# Altium schematic symbol library 13-Logicold 逻辑 IC.SchLib: 297 symbols (part 4 of 30) (continued)
## A3P1000-1PQG208I (continued)
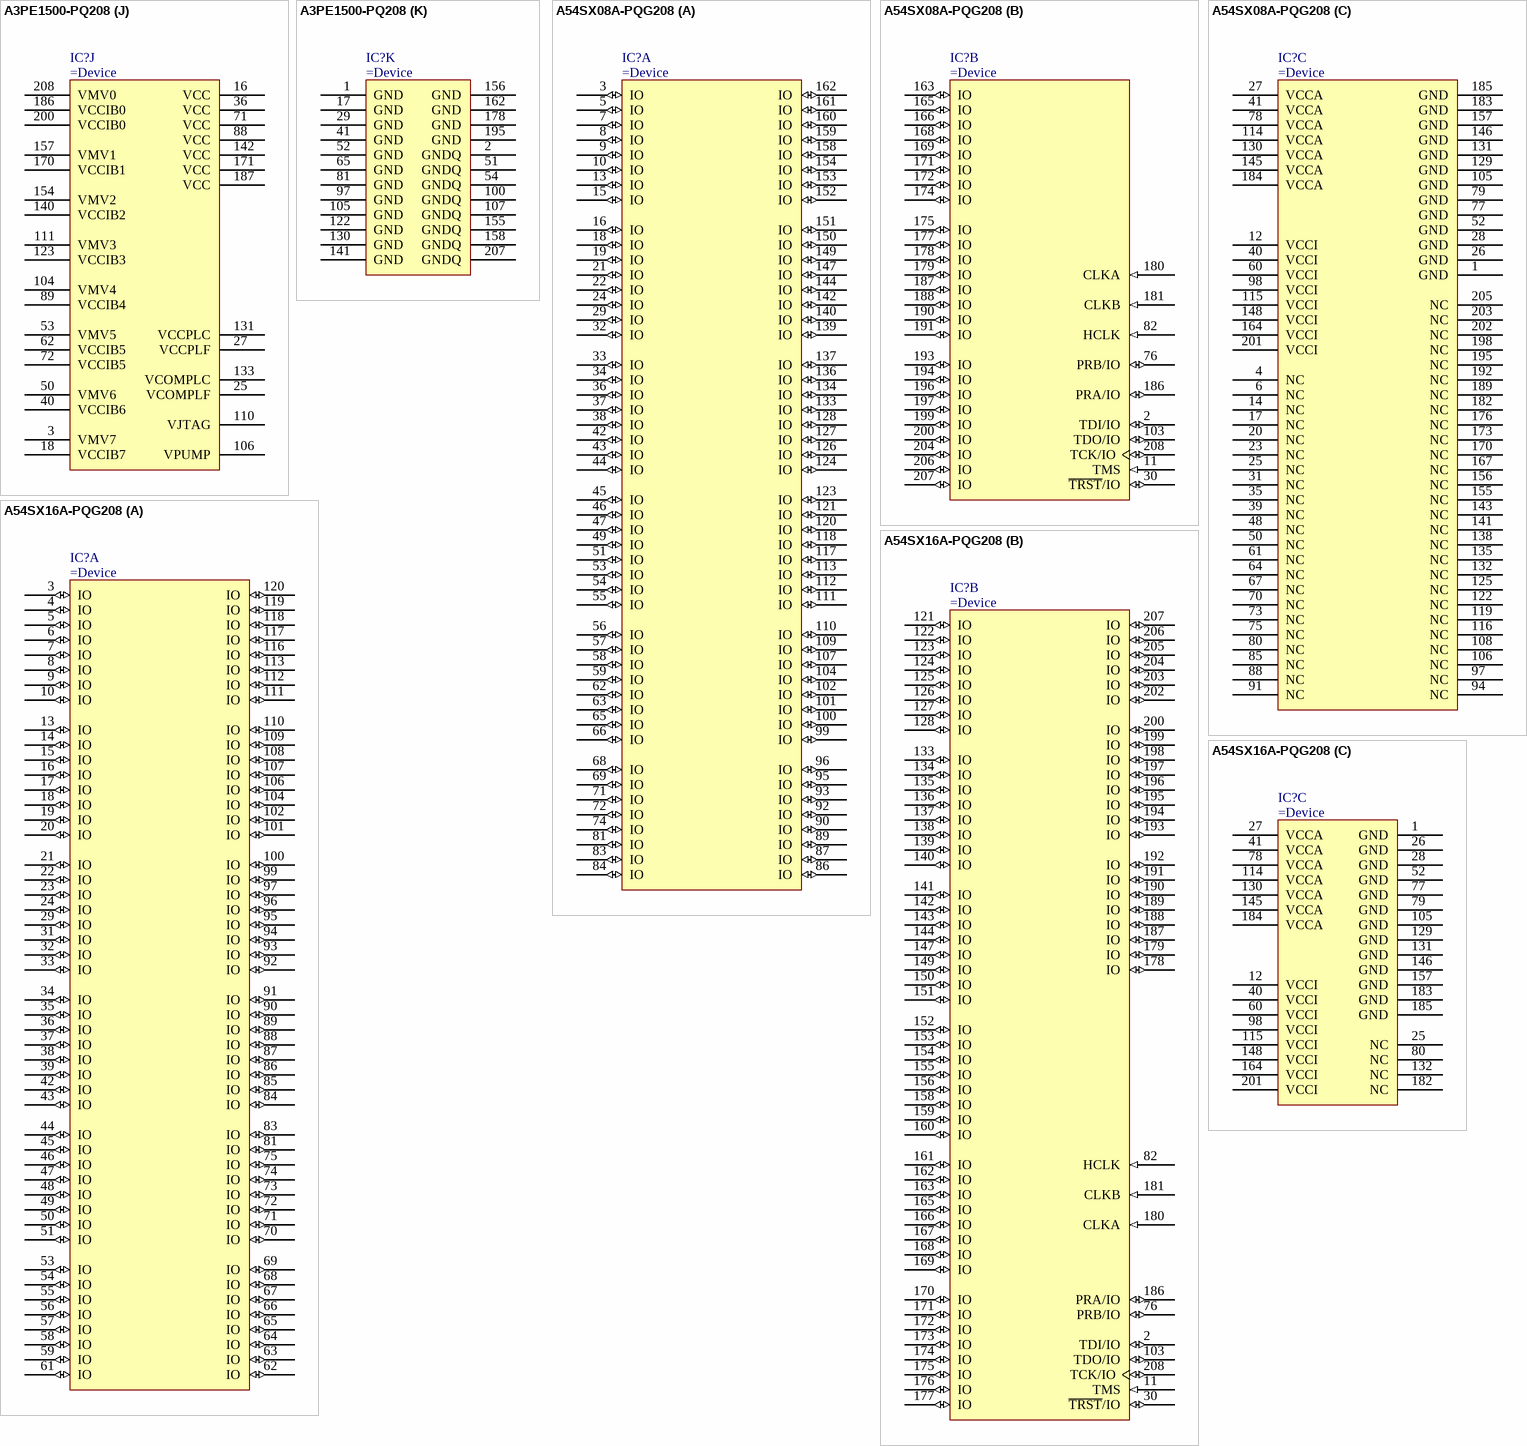
[diagram p22: symbols A3PE1500-PQ208 to A54SX16A-PQG208]
part A text: BANK 0
part B text: BANK 1
part C text: BANK 2
part D text: BANK 3

## A3PE1500-PQ208
designator IC?
ProASIC3E Flash Family FPGA, 147 User IOs, 1.5M System Gates, 270 Kbits RAM, 1 Kbit FlashROM, 2 PLLs, 208-Pin PQFP, Commercial Grade
part A pins: 177 IO31PDB0V3 (io), 179 IO31NDB0V3 (io), 180 IO29PDB0V3 (io), 181 IO29NDB0V3 (io), 182 IO27PDB0V3 (io), 183 IO27NDB0V3 (io), 184 IO23PDB0V2 (io), 185 IO23NDB0V2 (io), 188 IO18PDB0V2 (io), 189 IO18NDB0V2 (io), 190 IO15PDB0V1 (io), 191 IO15NDB0V1 (io), 192 IO12PSB0V1 (io), 193 IO11PDB0V1 (io), 194 IO11NDB0V1 (io), 196 IO08PDB0V1 (io), 197 IO08NDB0V1 (io), 198 IO05PDB0V0 (io), 199 IO05NDB0V0 (io), 201 GAC1/IO02PDB0V0 (io), 202 GAC0/IO02NDB0V0 (io), 203 GAB1/IO01PDB0V0 (io), 204 GAB0/IO01NDB0V0 (io), 205 GAA1/IO00PDB0V0 (io), 206 GAA0/IO00NDB0V0 (io)
part B pins: 159 GBA1/IO57PDB1V3 (io), 160 GBA0/IO57NDB1V3 (io), 161 GBB1/IO56PDB1V3 (io), 163 GBB0/IO56NDB1V3 (io), 164 GBC1/IO55PDB1V3 (io), 165 GBC0/IO55NDB1V3 (io), 166 IO51PDB1V2 (io), 167 IO51NDB1V2 (io), 168 IO47PDB1V1 (io), 169 IO47NDB1V1 (io), 172 IO43PSB1V1 (io), 173 IO41PDB1V1 (io), 174 IO41NDB1V1 (io), 175 IO35PDB1V0 (io), 176 IO35NDB1V0 (io)
part C pins: 134 GCB0/IO86NDB2V3 (io), 135 GCB1/IO86PDB2V3 (io), 136 GCC1/IO85PSB2V3 (io), 137 IO83NDB2V3 (io), 138 IO83PDB2V3 (io), 139 IO81PSB2V3 (io), 143 IO73NDB2V2 (io), 144 IO73PDB2V2 (io), 145 IO71NDB2V2 (io), 146 IO71PDB2V2 (io), 147 IO67NDB2V1 (io), 148 IO67PDB2V1 (io), 149 IO65NDB2V1 (io), 150 IO65PDB2V1 (io), 151 GBC2/IO60PSB2V0 (io), 152 GBA2/IO58PSB2V0 (io), 153 GBB2/IO59PSB2V0 (io)
part D pins: 112 GDA0/IO110NPB3V2 (io), 113 GDB0/IO109NPB3V2 (io), 114 GDA1/IO110PPB3V2 (io), 115 GDB1/IO109PPB3V2 (io), 116 GDC0/IO108NDB3V2 (io), 117 GDC1/IO108PDB3V2 (io), 118 IO105NDB3V2 (io), 119 IO105PDB3V2 (io), 120 IO101NDB3V1 (io), 121 IO101PDB3V1 (io), 124 GCC2/IO90PSB3V0 (io), 125 GCB2/IO89PSB3V0 (io), 127 IO88NDB3V0 (io), 128 GCA2/IO88PDB3V0 (io), 129 GCA1/IO87PPB3V0 (io), 132 GCA0/IO87NPB3V0 (io)
part E pins: 82 IO131NDB4V2 (io), 83 IO131PDB4V2 (io), 84 IO129NDB4V2 (io), 85 IO129PDB4V2 (io), 86 IO127NDB4V2 (io), 87 IO127PDB4V2 (io), 90 IO121NDB4V1 (io), 91 IO121PDB4V1 (io), 92 IO119NDB4V1 (io), 93 IO119PDB4V1 (io), 94 IO113NDB4V0 (io), 95 GDC2/IO113PDB4V0 (io), 96 IO112NDB4V0 (io), 98 GDB2/IO112PDB4V0 (io), 99 GDA2/IO111PSB4V0 (io)
part F pins: 55 IO166NDB5V3 (io), 56 GEA2/IO166PDB5V3 (io), 57 IO165NDB5V3 (io), 58 GEB2/IO165PDB5V3 (io), 59 IO164NDB5V3 (io), 60 GEC2/IO164PDB5V3 (io), 61 IO163PSB5V3 (io), 63 IO161PSB5V3 (io), 64 IO157NDB5V2 (io), 66 IO157PDB5V2 (io), 67 IO153NDB5V2 (io), 68 IO153PDB5V2 (io), 69 IO149NDB5V1 (io), 70 IO149PDB5V1 (io), 73 IO145NDB5V1 (io), 74 IO145PDB5V1 (io), 75 IO143NDB5V1 (io), 76 IO143PDB5V1 (io), 77 IO137NDB5V0 (io), 78 IO137PDB5V0 (io), 79 IO135NDB5V0 (io), 80 IO135PDB5V0 (io)
part G pins: 26 GFA0/IO190NPB6V2 (io), 28 GFA1/IO190PPB6V2 (io), 30 GFA2/IO189PDB6V2 (io), 31 IO189NDB6V2 (io), 32 GFB2/IO188PPB6V2 (io), 33 GFC2/IO187PPB6V2 (io), 34 IO188NPB6V2 (io), 35 IO187NPB6V2 (io), 37 IO184PDB6V2 (io), 38 IO184NDB6V2 (io), 39 IO180PSB6V1 (io), 42 IO176PDB6V1 (io), 43 IO176NDB6V1 (io), 44 GEC1/IO169PDB6V0 (io), 45 GEC0/IO169NDB6V0 (io), 46 GEB1/IO168PPB6V0 (io), 47 GEA1/IO167PPB6V0 (io), 48 GEB0/IO168NPB6V0 (io), 49 GEA0/IO167NPB6V0 (io)
part H pins: 4 GAB2/IO220PSB7V3 (io), 5 GAA2/IO221PDB7V3 (io), 6 IO221NDB7V3 (io), 7 GAC2/IO219PDB7V3 (io), 8 IO219NDB7V3 (io), 9 IO215PDB7V3 (io), 10 IO215NDB7V3 (io), 11 IO212PDB7V2 (io), 12 IO212NDB7V2 (io), 13 IO208PDB7V2 (io), 14 IO208NDB7V2 (io), 15 IO204PSB7V1 (io), 19 IO200PDB7V1 (io), 20 IO200NDB7V1 (io), 21 IO196PSB7V0 (io), 22 GFC1/IO192PSB7V0 (io), 23 GFB1/IO191PDB7V0 (io), 24 GFB0/IO191NDB7V0 (io)
part I pins: 101 TCK (in), 102 TDI (in), 103 TMS (in), 108 TDO (out), 109 ~{TRST} (in), 126 NC
part J pins: 3 VMV7 (power), 16 VCC (power), 18 VCCIB7 (power), 25 VCOMPLF (power), 27 VCCPLF (power), 36 VCC (power), 40 VCCIB6 (power), 50 VMV6 (power), 53 VMV5 (power), 62 VCCIB5 (power), 71 VCC (power), 72 VCCIB5 (power), 88 VCC (power), 89 VCCIB4 (power), 104 VMV4 (power), 106 VPUMP (power), 110 VJTAG (power), 111 VMV3 (power), 123 VCCIB3 (power), 131 VCCPLC (power), 133 VCOMPLC (power), 140 VCCIB2 (power), 142 VCC (power), 154 VMV2 (power), 157 VMV1 (power), 170 VCCIB1 (power), 171 VCC (power), 186 VCCIB0 (power), 187 VCC (power), 200 VCCIB0 (power), 208 VMV0 (power)
part K pins: 1 GND (power), 2 GNDQ (power), 17 GND (power), 29 GND (power), 41 GND (power), 51 GNDQ (power), 52 GND (power), 54 GNDQ (power), 65 GND (power), 81 GND (power), 97 GND (power), 100 GNDQ (power), 105 GND (power), 107 GNDQ (power), 122 GND (power), 130 GND (power), 141 GND (power), 155 GNDQ (power), 156 GND (power), 158 GNDQ (power), 162 GND (power), 178 GND (power), 195 GND (power), 207 GNDQ (power)
part A text: BANK 0
part B text: BANK 1
part C text: BANK 2
part D text: BANK 3
part E text: BANK 4
part F text: BANK 5
part G text: BANK 6
part H text: BANK 7

## A54SX08A-PQG208
designator IC?
A54SX16A FPGA, 130 User IOs, 208-Pin PQFP, Standard Speed Grade, Commercial Grade, Pb-Free
part A pins: 3 IO (io), 5 IO (io), 7 IO (io), 8 IO (io), 9 IO (io), 10 IO (io), 13 IO (io), 15 IO (io), 16 IO (io), 18 IO (io), 19 IO (io), 21 IO (io), 22 IO (io), 24 IO (io), 29 IO (io), 32 IO (io), 33 IO (io), 34 IO (io), 36 IO (io), 37 IO (io), 38 IO (io), 42 IO (io), 43 IO (io), 44 IO (io), 45 IO (io), 46 IO (io), 47 IO (io), 49 IO (io), 51 IO (io), 53 IO (io), 54 IO (io), 55 IO (io), 56 IO (io), 57 IO (io), 58 IO (io), 59 IO (io), 62 IO (io), 63 IO (io), 65 IO (io), 66 IO (io), 68 IO (io), 69 IO (io), 71 IO (io), 72 IO (io), 74 IO (io), 81 IO (io), 83 IO (io), 84 IO (io), 86 IO (io), 87 IO (io), 89 IO (io), 90 IO (io), 92 IO (io), 93 IO (io), 95 IO (io), 96 IO (io), 99 IO (io), 100 IO (io), 101 IO (io), 102 IO (io), 104 IO (io), 107 IO (io), 109 IO (io), 110 IO (io), 111 IO (io), 112 IO (io), 113 IO (io), 117 IO (io), 118 IO (io), 120 IO (io), 121 IO (io), 123 IO (io), 124 IO (io), 126 IO (io), 127 IO (io), 128 IO (io), 133 IO (io), 134 IO (io), 136 IO (io), 137 IO (io), 139 IO (io), 140 IO (io), 142 IO (io), 144 IO (io), 147 IO (io), 149 IO (io), 150 IO (io), 151 IO (io), 152 IO (io), 153 IO (io), 154 IO (io), 158 IO (io), 159 IO (io), 160 IO (io), 161 IO (io), 162 IO (io)
part B pins: 2 TDI/IO (io), 11 TMS (in), 30 ~{TRST}/IO (io), 76 PRB/IO (io), 82 HCLK (in), 103 TDO/IO (io), 163 IO (io), 165 IO (io), 166 IO (io), 168 IO (io), 169 IO (io), 171 IO (io), 172 IO (io), 174 IO (io), 175 IO (io), 177 IO (io), 178 IO (io), 179 IO (io), 180 CLKA (in), 181 CLKB (in), 186 PRA/IO (io), 187 IO (io), 188 IO (io), 190 IO (io), 191 IO (io), 193 IO (io), 194 IO (io), 196 IO (io), 197 IO (io), 199 IO (io), 200 IO (io), 204 IO (io), 206 IO (io), 207 IO (io), 208 TCK/IO (io)
part C pins: 1 GND (power), 4 NC, 6 NC, 12 VCCI (power), 14 NC, 17 NC, 20 NC, 23 NC, 25 NC, 26 GND (power), 27 VCCA (power), 28 GND (power), 31 NC, 35 NC, 39 NC, 40 VCCI (power), 41 VCCA (power), 48 NC, 50 NC, 52 GND (power), 60 VCCI (power), 61 NC, 64 NC, 67 NC, 70 NC, 73 NC, 75 NC, 77 GND (power), 78 VCCA (power), 79 GND (power), 80 NC, 85 NC, 88 NC, 91 NC, 94 NC, 97 NC, 98 VCCI (power), 105 GND (power), 106 NC, 108 NC, 114 VCCA (power), 115 VCCI (power), 116 NC, 119 NC, 122 NC, 125 NC, 129 GND (power), 130 VCCA (power), 131 GND (power), 132 NC, 135 NC, 138 NC, 141 NC, 143 NC, 145 VCCA (power), 146 GND (power), 148 VCCI (power), 155 NC, 156 NC, 157 GND (power), 164 VCCI (power), 167 NC, 170 NC, 173 NC, 176 NC, 182 NC, 183 GND (power), 184 VCCA (power), 185 GND (power), 189 NC, 192 NC, 195 NC, 198 NC, 201 VCCI (power), 202 NC, 203 NC, 205 NC

## A54SX16A-PQG208
designator IC?
A54SX16A FPGA, 175 User IOs, 208-Pin PQFP, Standard Speed Grade, Commercial Grade, Pb-Free
part A pins: 3 IO (io), 4 IO (io), 5 IO (io), 6 IO (io), 7 IO (io), 8 IO (io), 9 IO (io), 10 IO (io), 13 IO (io), 14 IO (io), 15 IO (io), 16 IO (io), 17 IO (io), 18 IO (io), 19 IO (io), 20 IO (io), 21 IO (io), 22 IO (io), 23 IO (io), 24 IO (io), 29 IO (io), 31 IO (io), 32 IO (io), 33 IO (io), 34 IO (io), 35 IO (io), 36 IO (io), 37 IO (io), 38 IO (io), 39 IO (io), 42 IO (io), 43 IO (io), 44 IO (io), 45 IO (io), 46 IO (io), 47 IO (io), 48 IO (io), 49 IO (io), 50 IO (io), 51 IO (io), 53 IO (io), 54 IO (io), 55 IO (io), 56 IO (io), 57 IO (io), 58 IO (io), 59 IO (io), 61 IO (io), 62 IO (io), 63 IO (io), 64 IO (io), 65 IO (io), 66 IO (io), 67 IO (io), 68 IO (io), 69 IO (io), 70 IO (io), 71 IO (io), 72 IO (io), 73 IO (io), 74 IO (io), 75 IO (io), 81 IO (io), 83 IO (io), 84 IO (io), 85 IO (io), 86 IO (io), 87 IO (io), 88 IO (io), 89 IO (io), 90 IO (io), 91 IO (io), 92 IO (io), 93 IO (io), 94 IO (io), 95 IO (io), 96 IO (io), 97 IO (io), 99 IO (io), 100 IO (io), 101 IO (io), 102 IO (io), 104 IO (io), 106 IO (io), 107 IO (io), 108 IO (io), 109 IO (io), 110 IO (io), 111 IO (io), 112 IO (io), 113 IO (io), 116 IO (io), 117 IO (io), 118 IO (io), 119 IO (io), 120 IO (io)
part B pins: 2 TDI/IO (io), 11 TMS (in), 30 ~{TRST}/IO (io), 76 PRB/IO (io), 82 HCLK (in), 103 TDO/IO (io), 121 IO (io), 122 IO (io), 123 IO (io), 124 IO (io), 125 IO (io), 126 IO (io), 127 IO (io), 128 IO (io), 133 IO (io), 134 IO (io), 135 IO (io), 136 IO (io), 137 IO (io), 138 IO (io), 139 IO (io), 140 IO (io), 141 IO (io), 142 IO (io), 143 IO (io), 144 IO (io), 147 IO (io), 149 IO (io), 150 IO (io), 151 IO (io), 152 IO (io), 153 IO (io), 154 IO (io), 155 IO (io), 156 IO (io), 158 IO (io), 159 IO (io), 160 IO (io), 161 IO (io), 162 IO (io), 163 IO (io), 165 IO (io), 166 IO (io), 167 IO (io), 168 IO (io), 169 IO (io), 170 IO (io), 171 IO (io), 172 IO (io), 173 IO (io), 174 IO (io), 175 IO (io), 176 IO (io), 177 IO (io), 178 IO (io), 179 IO (io), 180 CLKA (in), 181 CLKB (in), 186 PRA/IO (io), 187 IO (io), 188 IO (io), 189 IO (io), 190 IO (io), 191 IO (io), 192 IO (io), 193 IO (io), 194 IO (io), 195 IO (io), 196 IO (io), 197 IO (io), 198 IO (io), 199 IO (io), 200 IO (io), 202 IO (io), 203 IO (io), 204 IO (io), 205 IO (io), 206 IO (io), 207 IO (io), 208 TCK/IO (io)
part C pins: 1 GND (power), 12 VCCI (power), 25 NC, 26 GND (power), 27 VCCA (power), 28 GND (power), 40 VCCI (power), 41 VCCA (power), 52 GND (power), 60 VCCI (power), 77 GND (power), 78 VCCA (power), 79 GND (power), 80 NC, 98 VCCI (power), 105 GND (power), 114 VCCA (power), 115 VCCI (power), 129 GND (power), 130 VCCA (power), 131 GND (power), 132 NC, 145 VCCA (power), 146 GND (power), 148 VCCI (power), 157 GND (power), 164 VCCI (power), 182 NC, 183 GND (power), 184 VCCA (power), 185 GND (power), 201 VCCI (power)

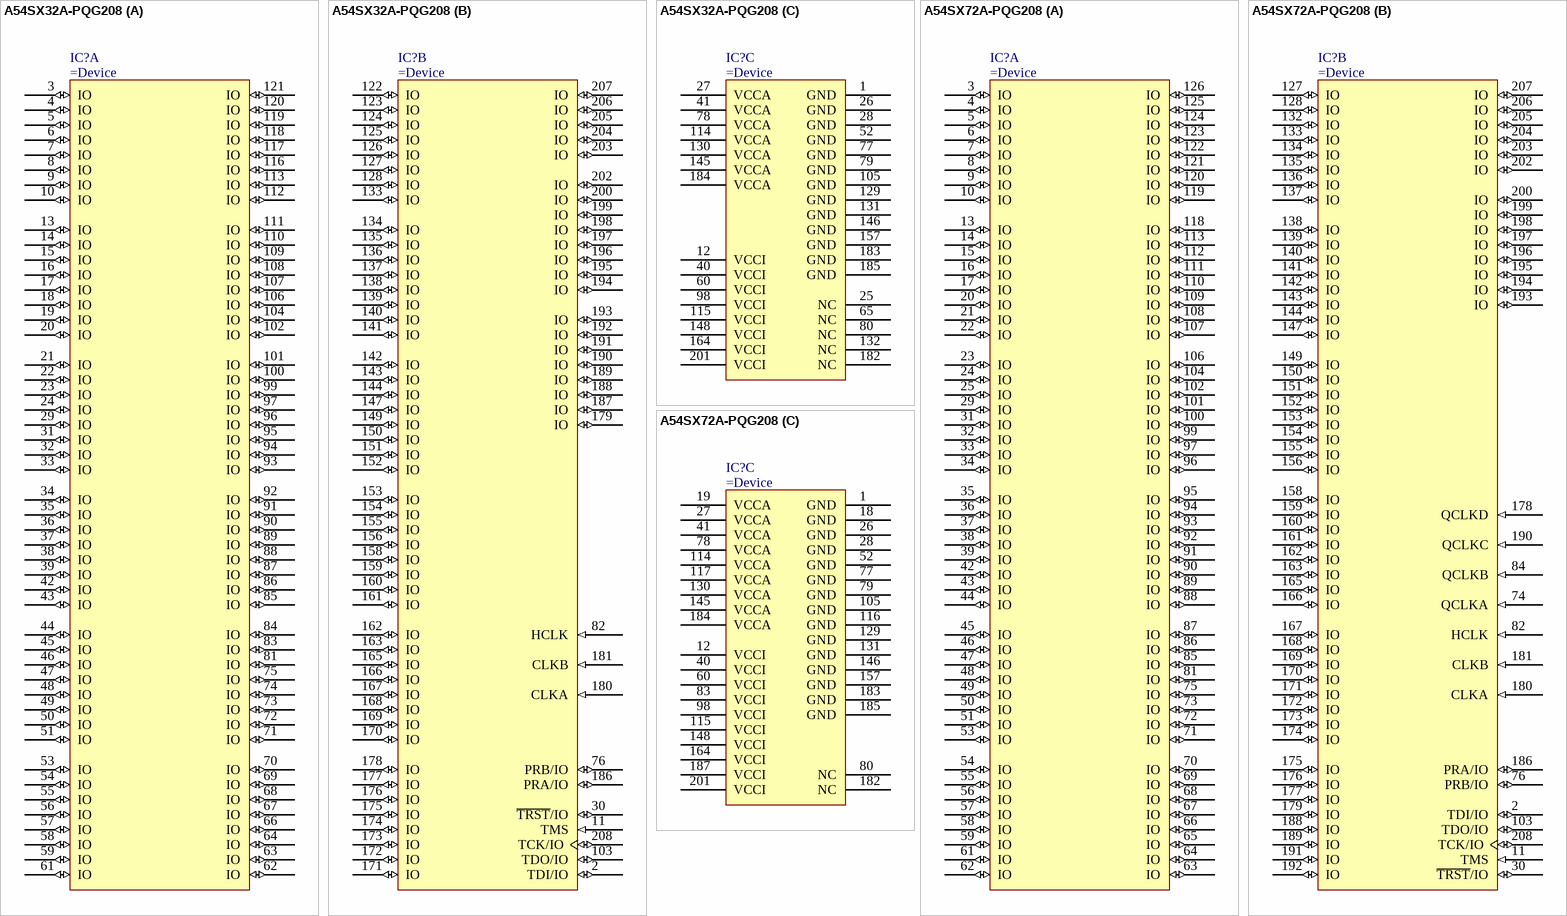
[diagram p23: symbols A54SX32A-PQG208 to A54SX72A-PQG208]

## A54SX32A-PQG208
designator IC?
A54SX32A FPGA, 174 User IOs, 208-Pin PQFP, Standard Speed Grade, Commercial Grade, Pb-Free
part A pins: 3 IO (io), 4 IO (io), 5 IO (io), 6 IO (io), 7 IO (io), 8 IO (io), 9 IO (io), 10 IO (io), 13 IO (io), 14 IO (io), 15 IO (io), 16 IO (io), 17 IO (io), 18 IO (io), 19 IO (io), 20 IO (io), 21 IO (io), 22 IO (io), 23 IO (io), 24 IO (io), 29 IO (io), 31 IO (io), 32 IO (io), 33 IO (io), 34 IO (io), 35 IO (io), 36 IO (io), 37 IO (io), 38 IO (io), 39 IO (io), 42 IO (io), 43 IO (io), 44 IO (io), 45 IO (io), 46 IO (io), 47 IO (io), 48 IO (io), 49 IO (io), 50 IO (io), 51 IO (io), 53 IO (io), 54 IO (io), 55 IO (io), 56 IO (io), 57 IO (io), 58 IO (io), 59 IO (io), 61 IO (io), 62 IO (io), 63 IO (io), 64 IO (io), 66 IO (io), 67 IO (io), 68 IO (io), 69 IO (io), 70 IO (io), 71 IO (io), 72 IO (io), 73 IO (io), 74 IO (io), 75 IO (io), 81 IO (io), 83 IO (io), 84 IO (io), 85 IO (io), 86 IO (io), 87 IO (io), 88 IO (io), 89 IO (io), 90 IO (io), 91 IO (io), 92 IO (io), 93 IO (io), 94 IO (io), 95 IO (io), 96 IO (io), 97 IO (io), 99 IO (io), 100 IO (io), 101 IO (io), 102 IO (io), 104 IO (io), 106 IO (io), 107 IO (io), 108 IO (io), 109 IO (io), 110 IO (io), 111 IO (io), 112 IO (io), 113 IO (io), 116 IO (io), 117 IO (io), 118 IO (io), 119 IO (io), 120 IO (io), 121 IO (io)
part B pins: 2 TDI/IO (io), 11 TMS (in), 30 ~{TRST}/IO (io), 76 PRB/IO (io), 82 HCLK (in), 103 TDO/IO (io), 122 IO (io), 123 IO (io), 124 IO (io), 125 IO (io), 126 IO (io), 127 IO (io), 128 IO (io), 133 IO (io), 134 IO (io), 135 IO (io), 136 IO (io), 137 IO (io), 138 IO (io), 139 IO (io), 140 IO (io), 141 IO (io), 142 IO (io), 143 IO (io), 144 IO (io), 147 IO (io), 149 IO (io), 150 IO (io), 151 IO (io), 152 IO (io), 153 IO (io), 154 IO (io), 155 IO (io), 156 IO (io), 158 IO (io), 159 IO (io), 160 IO (io), 161 IO (io), 162 IO (io), 163 IO (io), 165 IO (io), 166 IO (io), 167 IO (io), 168 IO (io), 169 IO (io), 170 IO (io), 171 IO (io), 172 IO (io), 173 IO (io), 174 IO (io), 175 IO (io), 176 IO (io), 177 IO (io), 178 IO (io), 179 IO (io), 180 CLKA (in), 181 CLKB (in), 186 PRA/IO (io), 187 IO (io), 188 IO (io), 189 IO (io), 190 IO (io), 191 IO (io), 192 IO (io), 193 IO (io), 194 IO (io), 195 IO (io), 196 IO (io), 197 IO (io), 198 IO (io), 199 IO (io), 200 IO (io), 202 IO (io), 203 IO (io), 204 IO (io), 205 IO (io), 206 IO (io), 207 IO (io), 208 TCK/IO (io)
part C pins: 1 GND (power), 12 VCCI (power), 25 NC, 26 GND (power), 27 VCCA (power), 28 GND (power), 40 VCCI (power), 41 VCCA (power), 52 GND (power), 60 VCCI (power), 65 NC, 77 GND (power), 78 VCCA (power), 79 GND (power), 80 NC, 98 VCCI (power), 105 GND (power), 114 VCCA (power), 115 VCCI (power), 129 GND (power), 130 VCCA (power), 131 GND (power), 132 NC, 145 VCCA (power), 146 GND (power), 148 VCCI (power), 157 GND (power), 164 VCCI (power), 182 NC, 183 GND (power), 184 VCCA (power), 185 GND (power), 201 VCCI (power)

## A54SX72A-PQG208
designator IC?
A54SX72A FPGA, 171 User IOs, 208-Pin PQFP, Standard Speed Grade, Commercial Grade, Pb-Free
part A pins: 3 IO (io), 4 IO (io), 5 IO (io), 6 IO (io), 7 IO (io), 8 IO (io), 9 IO (io), 10 IO (io), 13 IO (io), 14 IO (io), 15 IO (io), 16 IO (io), 17 IO (io), 20 IO (io), 21 IO (io), 22 IO (io), 23 IO (io), 24 IO (io), 25 IO (io), 29 IO (io), 31 IO (io), 32 IO (io), 33 IO (io), 34 IO (io), 35 IO (io), 36 IO (io), 37 IO (io), 38 IO (io), 39 IO (io), 42 IO (io), 43 IO (io), 44 IO (io), 45 IO (io), 46 IO (io), 47 IO (io), 48 IO (io), 49 IO (io), 50 IO (io), 51 IO (io), 53 IO (io), 54 IO (io), 55 IO (io), 56 IO (io), 57 IO (io), 58 IO (io), 59 IO (io), 61 IO (io), 62 IO (io), 63 IO (io), 64 IO (io), 65 IO (io), 66 IO (io), 67 IO (io), 68 IO (io), 69 IO (io), 70 IO (io), 71 IO (io), 72 IO (io), 73 IO (io), 75 IO (io), 81 IO (io), 85 IO (io), 86 IO (io), 87 IO (io), 88 IO (io), 89 IO (io), 90 IO (io), 91 IO (io), 92 IO (io), 93 IO (io), 94 IO (io), 95 IO (io), 96 IO (io), 97 IO (io), 99 IO (io), 100 IO (io), 101 IO (io), 102 IO (io), 104 IO (io), 106 IO (io), 107 IO (io), 108 IO (io), 109 IO (io), 110 IO (io), 111 IO (io), 112 IO (io), 113 IO (io), 118 IO (io), 119 IO (io), 120 IO (io), 121 IO (io), 122 IO (io), 123 IO (io), 124 IO (io), 125 IO (io), 126 IO (io)
part B pins: 2 TDI/IO (io), 11 TMS (in), 30 ~{TRST}/IO (io), 74 QCLKA (in), 76 PRB/IO (io), 82 HCLK (in), 84 QCLKB (in), 103 TDO/IO (io), 127 IO (io), 128 IO (io), 132 IO (io), 133 IO (io), 134 IO (io), 135 IO (io), 136 IO (io), 137 IO (io), 138 IO (io), 139 IO (io), 140 IO (io), 141 IO (io), 142 IO (io), 143 IO (io), 144 IO (io), 147 IO (io), 149 IO (io), 150 IO (io), 151 IO (io), 152 IO (io), 153 IO (io), 154 IO (io), 155 IO (io), 156 IO (io), 158 IO (io), 159 IO (io), 160 IO (io), 161 IO (io), 162 IO (io), 163 IO (io), 165 IO (io), 166 IO (io), 167 IO (io), 168 IO (io), 169 IO (io), 170 IO (io), 171 IO (io), 172 IO (io), 173 IO (io), 174 IO (io), 175 IO (io), 176 IO (io), 177 IO (io), 178 QCLKD (in), 179 IO (io), 180 CLKA (in), 181 CLKB (in), 186 PRA/IO (io), 188 IO (io), 189 IO (io), 190 QCLKC (in), 191 IO (io), 192 IO (io), 193 IO (io), 194 IO (io), 195 IO (io), 196 IO (io), 197 IO (io), 198 IO (io), 199 IO (io), 200 IO (io), 202 IO (io), 203 IO (io), 204 IO (io), 205 IO (io), 206 IO (io), 207 IO (io), 208 TCK/IO (io)
part C pins: 1 GND (power), 12 VCCI (power), 18 GND (power), 19 VCCA (power), 26 GND (power), 27 VCCA (power), 28 GND (power), 40 VCCI (power), 41 VCCA (power), 52 GND (power), 60 VCCI (power), 77 GND (power), 78 VCCA (power), 79 GND (power), 80 NC, 83 VCCI (power), 98 VCCI (power), 105 GND (power), 114 VCCA (power), 115 VCCI (power), 116 GND (power), 117 VCCA (power), 129 GND (power), 130 VCCA (power), 131 GND (power), 145 VCCA (power), 146 GND (power), 148 VCCI (power), 157 GND (power), 164 VCCI (power), 182 NC, 183 GND (power), 184 VCCA (power), 185 GND (power), 187 VCCI (power), 201 VCCI (power)

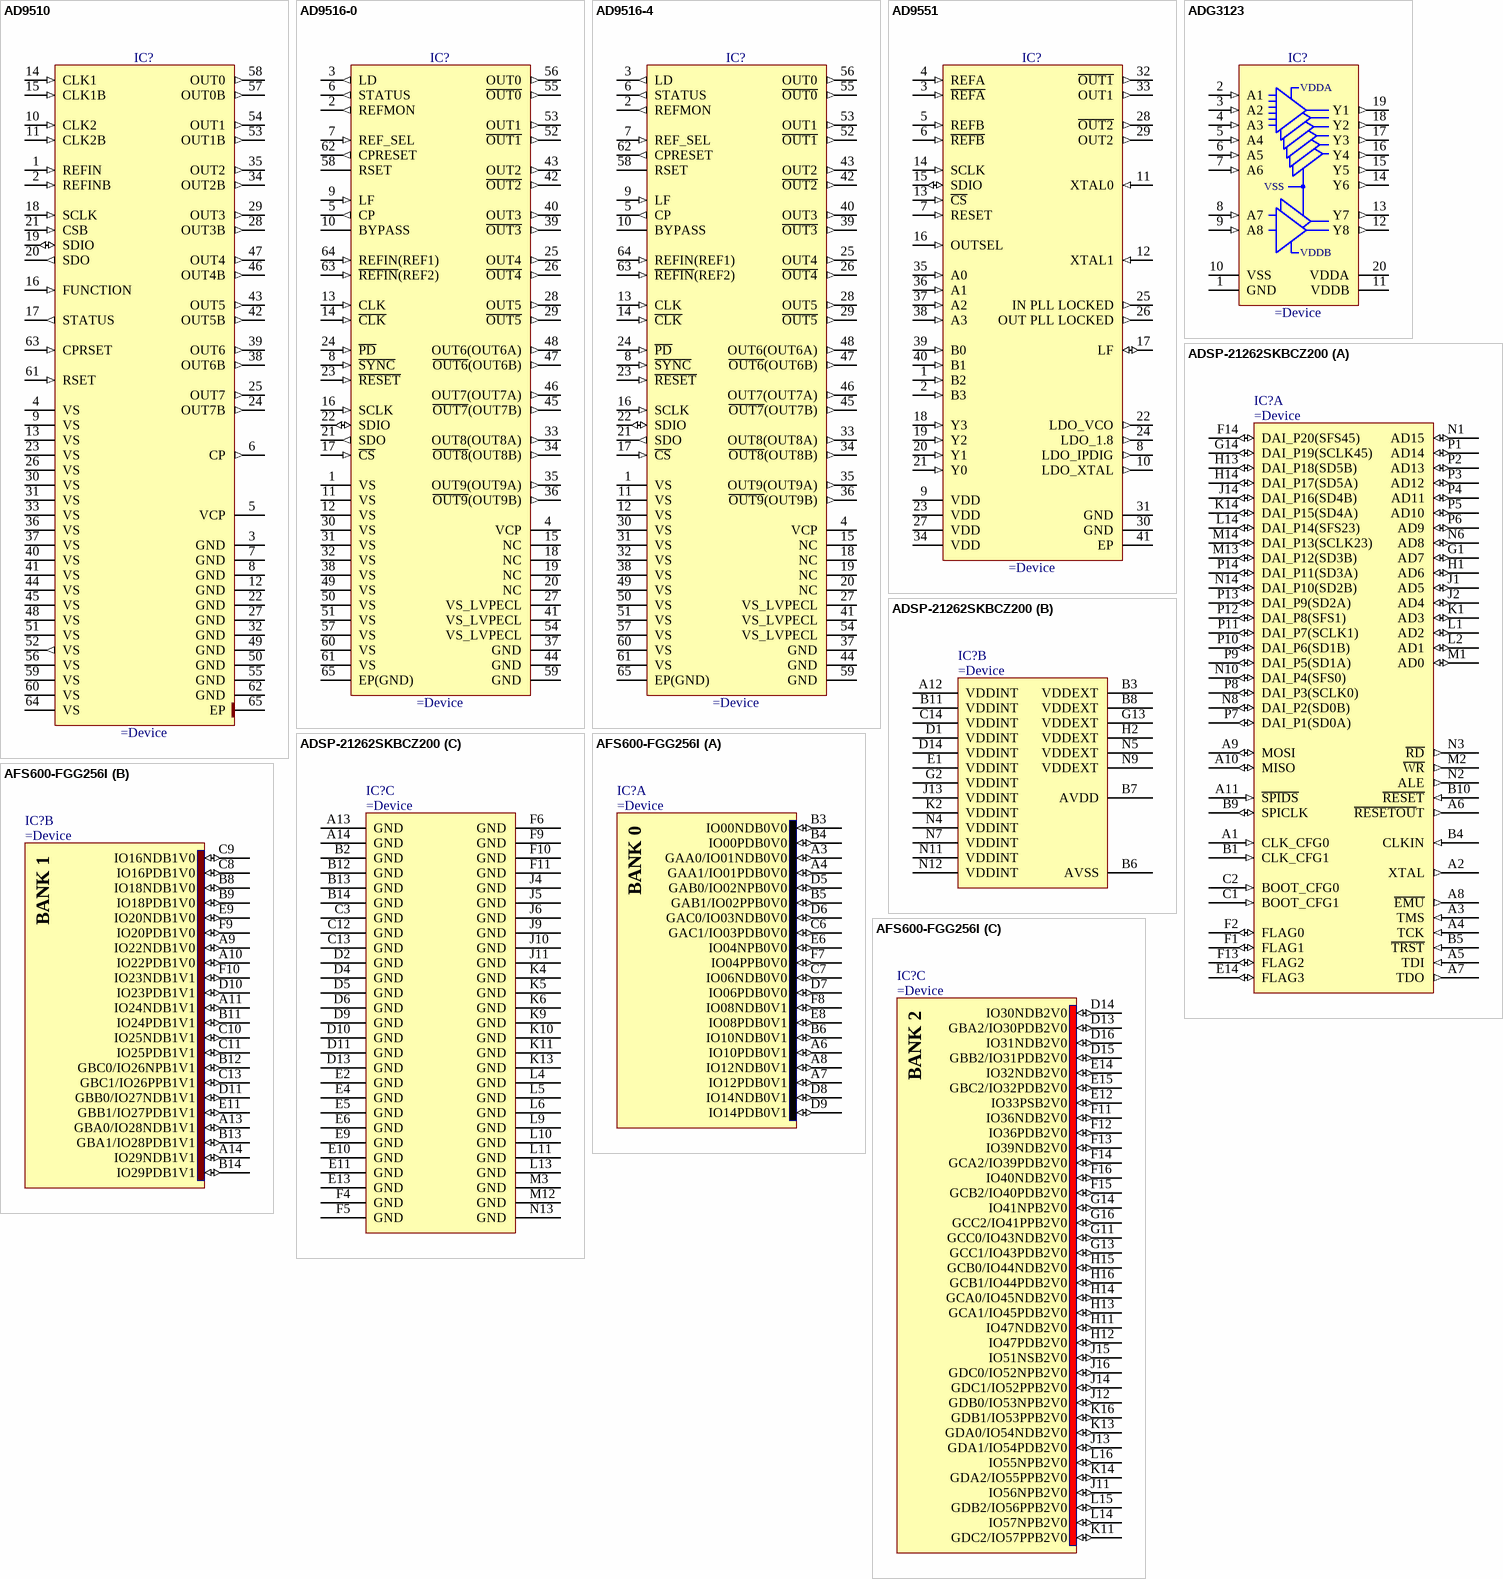
[diagram p24: symbols AD9510 to AFS600-FGG256I]

## AD9510
designator IC?
1.2 GHz Clock Distribution IC, PLL Core, Dividers, Delay Adjust, Eight Outputs
pins: 1 REFIN (in), 2 REFINB (in), 3 GND (power), 4 VS (power), 5 VCP (power), 6 CP (out), 7 GND (power), 8 GND (power), 9 VS (power), 10 CLK2 (in), 11 CLK2B (in), 12 GND (power), 13 VS (power), 14 CLK1 (in), 15 CLK1B (in), 16 FUNCTION (in), 17 STATUS (out), 18 SCLK (in), 19 SDIO (io), 20 SDO (out), 21 CSB (in), 22 GND (power), 23 VS (power), 24 OUT7B (out), 25 OUT7 (out), 26 VS (power), 27 GND (power), 28 OUT3B (out), 29 OUT3 (out), 30 VS (power), 31 VS (power), 32 GND (power), 33 VS (power), 34 OUT2B (out), 35 OUT2 (out), 36 VS (power), 37 VS (power), 38 OUT6B (out), 39 OUT6 (out), 40 VS (power), 41 VS (power), 42 OUT5B (out), 43 OUT5 (out), 44 VS (power), 45 VS (power), 46 OUT4B (out), 47 OUT4 (out), 48 VS (power), 49 GND (power), 50 GND (power), 51 VS (power), 52 VS (out), 53 OUT1B (out), 54 OUT1 (out), 55 GND (power), 56 VS (power), 57 OUT0B (out), 58 OUT0 (out), 59 VS (power), 60 VS (power), 61 RSET (in), 62 GND (power), 63 CPRSET (in), 64 VS (power), 65 EP (power)

## AD9516-0
designator IC?
14-Output Clock Generator with Integrated 2.8 GHz VCO
pins: 1 VS (power), 2 REFMON (out), 3 LD (out), 4 VCP (power), 5 CP (out), 6 STATUS (out), 7 REF_SEL (in), 8 ~{SYNC} (in), 9 LF (in), 10 BYPASS, 11 VS (power), 12 VS (power), 13 CLK (in), 14 ~{CLK} (in), 15 NC, 16 SCLK (in), 17 ~{CS} (in), 18 NC, 19 NC, 20 NC, 21 SDO (out), 22 SDIO (io), 23 ~{RESET} (in), 24 ~{PD} (in), 25 OUT4 (out), 26 ~{OUT4} (out), 27 VS_LVPECL (power), 28 OUT5 (out), 29 ~{OUT5} (out), 30 VS (power), 31 VS (power), 32 VS (power), 33 OUT8(OUT8A) (out), 34 ~{OUT8}(OUT8B) (out), 35 OUT9(OUT9A) (out), 36 ~{OUT9}(OUT9B) (out), 37 GND (power), 38 VS (power), 39 ~{OUT3} (out), 40 OUT3 (out), 41 VS_LVPECL (power), 42 ~{OUT2} (out), 43 OUT2 (out), 44 GND (power), 45 ~{OUT7}(OUT7B) (out), 46 OUT7(OUT7A) (out), 47 ~{OUT6}(OUT6B) (out), 48 OUT6(OUT6A) (out), 49 VS (power), 50 VS (power), 51 VS (power), 52 ~{OUT1} (out), 53 OUT1 (out), 54 VS_LVPECL (power), 55 ~{OUT0} (out), 56 OUT0 (out), 57 VS (power), 58 RSET, 59 GND (power), 60 VS (power), 61 VS (power), 62 CPRESET (out), 63 ~{REFIN}(REF2) (in), 64 REFIN(REF1) (in), 65 EP(GND) (power)

## AD9516-4
designator IC?
14-Output Clock Generator with Integrated 1.6 GHz VCO
pins: 1 VS (power), 2 REFMON (out), 3 LD (out), 4 VCP (power), 5 CP (out), 6 STATUS (out), 7 REF_SEL (in), 8 ~{SYNC} (in), 9 LF (in), 10 BYPASS, 11 VS (power), 12 VS (power), 13 CLK (in), 14 ~{CLK} (in), 15 NC, 16 SCLK (in), 17 ~{CS} (in), 18 NC, 19 NC, 20 NC, 21 SDO (out), 22 SDIO (io), 23 ~{RESET} (in), 24 ~{PD} (in), 25 OUT4 (out), 26 ~{OUT4} (out), 27 VS_LVPECL (power), 28 OUT5 (out), 29 ~{OUT5} (out), 30 VS (power), 31 VS (power), 32 VS (power), 33 OUT8(OUT8A) (out), 34 ~{OUT8}(OUT8B) (out), 35 OUT9(OUT9A) (out), 36 ~{OUT9}(OUT9B) (out), 37 GND (power), 38 VS (power), 39 ~{OUT3} (out), 40 OUT3 (out), 41 VS_LVPECL (power), 42 ~{OUT2} (out), 43 OUT2 (out), 44 GND (power), 45 ~{OUT7}(OUT7B) (out), 46 OUT7(OUT7A) (out), 47 ~{OUT6}(OUT6B) (out), 48 OUT6(OUT6A) (out), 49 VS (power), 50 VS (power), 51 VS (power), 52 ~{OUT1} (out), 53 OUT1 (out), 54 VS_LVPECL (power), 55 ~{OUT0} (out), 56 OUT0 (out), 57 VS (power), 58 RSET, 59 GND (power), 60 VS (power), 61 VS (power), 62 CPRESET (out), 63 ~{REFIN}(REF2) (in), 64 REFIN(REF1) (in), 65 EP(GND) (power)

## AD9551
designator IC?
Multiservice Clock Generator
pins: 1 B2 (in), 2 B3 (in), 3 ~{REFA} (in), 4 REFA (in), 5 REFB (in), 6 ~{REFB} (in), 7 RESET (in), 8 LDO_IPDIG (out), 9 VDD (power), 10 LDO_XTAL (out), 11 XTAL0 (in), 12 XTAL1 (in), 13 ~{CS} (in), 14 SCLK (in), 15 SDIO (io), 16 OUTSEL (in), 17 LF (io), 18 Y3 (in), 19 Y2 (in), 20 Y1 (in), 21 Y0 (in), 22 LDO_VCO (out), 23 VDD (power), 24 LDO_1.8 (out), 25 IN PLL LOCKED (out), 26 OUT PLL LOCKED (out), 27 VDD (power), 28 ~{OUT2} (out), 29 OUT2 (out), 30 GND (power), 31 GND (power), 32 ~{OUT1} (out), 33 OUT1 (out), 34 VDD (power), 35 A0 (in), 36 A1 (in), 37 A2 (in), 38 A3 (in), 39 B0 (in), 40 B1 (in), 41 EP (power)

## ADG3123
designator IC?
8-Channel CMOS Logic to High Voltage Level Translator
pins: 1 GND (power) "Ground Reference (0 V).", 2 A1 (in) "Level Translator CMOS Inputs.", 3 A2 (in) "Level Translator CMOS Inputs.", 4 A3 (in) "Level Translator CMOS Inputs.", 5 A4 (in) "Level Translator CMOS Inputs.", 6 A5 (in) "Level Translator CMOS Inputs.", 7 A6 (in) "Level Translator CMOS Inputs.", 8 A7 (in) "Level Translator CMOS Inputs.", 9 A8 (in) "Level Translator CMOS Inputs.", 10 VSS (power) "Most Negative Power Supply.", 11 VDDB (power) "Positive Power Supply.", 12 Y8 (out) "Level Translator High Voltage Outputs.", 13 Y7 (out) "Level Translator High Voltage Outputs.", 14 Y6 (out) "Level Translator High Voltage Outputs.", 15 Y5 (out) "Level Translator High Voltage Outputs.", 16 Y4 (out) "Level Translator High Voltage Outputs.", 17 Y3 (out) "Level Translator High Voltage Outputs.", 18 Y2 (out) "Level Translator High Voltage Outputs.", 19 Y1 (out) "Level Translator High Voltage Outputs.", 20 VDDA (power) "Analog Input."

## ADSP-21262SKBCZ200
designator IC?
Low Cost 32-Bit Floating-Point SHARC DSP
part A pins: A1 CLK_CFG0 (in), A2 XTAL (out), A3 TMS (in), A4 TCK (in), A5 TDI (in), A6 ~{RESETOU}T (out), A7 TDO (out), A8 ~{EMU} (out), A9 MOSI (io), A10 MISO (io), A11 ~{SPIDS} (in), B1 CLK_CFG1 (in), B4 CLKIN (in), B5 ~{TRST} (in), B9 SPICLK (io), B10 ~{RESET} (in), C1 BOOT_CFG1 (in), C2 BOOT_CFG0 (in), E14 FLAG3 (io), F1 FLAG1 (io), F2 FLAG0 (io), F13 FLAG2 (io), F14 DAI_P20(SFS45) (io), G1 AD7 (io), G14 DAI_P19(SCLK45) (io), H1 AD6 (io), H13 DAI_P18(SD5B) (io), H14 DAI_P17(SD5A) (io), J1 AD5 (io), J2 AD4 (io), J14 DAI_P16(SD4B) (io), K1 AD3 (io), K14 DAI_P15(SD4A) (io), L1 AD2 (io), L2 AD1 (io), L14 DAI_P14(SFS23) (io), M1 AD0 (io), M2 ~{WR} (out), M13 DAI_P12(SD3B) (io), M14 DAI_P13(SCLK23) (io), N1 AD15 (io), N2 ALE (out), N3 ~{RD} (out), N6 AD8 (io), N8 DAI_P2(SD0B) (io), N10 DAI_P4(SFS0) (io), N14 DAI_P10(SD2B) (io), P1 AD14 (io), P2 AD13 (io), P3 AD12 (io), P4 AD11 (io), P5 AD10 (io), P6 AD9 (io), P7 DAI_P1(SD0A) (io), P8 DAI_P3(SCLK0) (io), P9 DAI_P5(SD1A) (io), P10 DAI_P6(SD1B) (io), P11 DAI_P7(SCLK1) (io), P12 DAI_P8(SFS1) (io), P13 DAI_P9(SD2A) (io), P14 DAI_P11(SD3A) (io)
part B pins: A12 VDDINT (power), B3 VDDEXT (power), B6 AVSS (power), B7 AVDD (power), B8 VDDEXT (power), B11 VDDINT (power), C14 VDDINT (power), D1 VDDINT (power), D14 VDDINT (power), E1 VDDINT (power), G2 VDDINT (power), G13 VDDEXT (power), H2 VDDEXT (power), J13 VDDINT (power), K2 VDDINT (power), N4 VDDINT (power), N5 VDDEXT (power), N7 VDDINT (power), N9 VDDEXT (power), N11 VDDINT (power), N12 VDDINT (power)
part C pins: A13 GND (power), A14 GND (power), B2 GND (power), B12 GND (power), B13 GND (power), B14 GND (power), C3 GND (power), C12 GND (power), C13 GND (power), D2 GND (power), D4 GND (power), D5 GND (power), D6 GND (power), D9 GND (power), D10 GND (power), D11 GND (power), D13 GND (power), E2 GND (power), E4 GND (power), E5 GND (power), E6 GND (power), E9 GND (power), E10 GND (power), E11 GND (power), E13 GND (power), F4 GND (power), F5 GND (power), F6 GND (power), F9 GND (power), F10 GND (power), F11 GND (power), J4 GND (power), J5 GND (power), J6 GND (power), J9 GND (power), J10 GND (power), J11 GND (power), K4 GND (power), K5 GND (power), K6 GND (power), K9 GND (power), K10 GND (power), K11 GND (power), K13 GND (power), L4 GND (power), L5 GND (power), L6 GND (power), L9 GND (power), L10 GND (power), L11 GND (power), L13 GND (power), M3 GND (power), M12 GND (power), N13 GND (power)

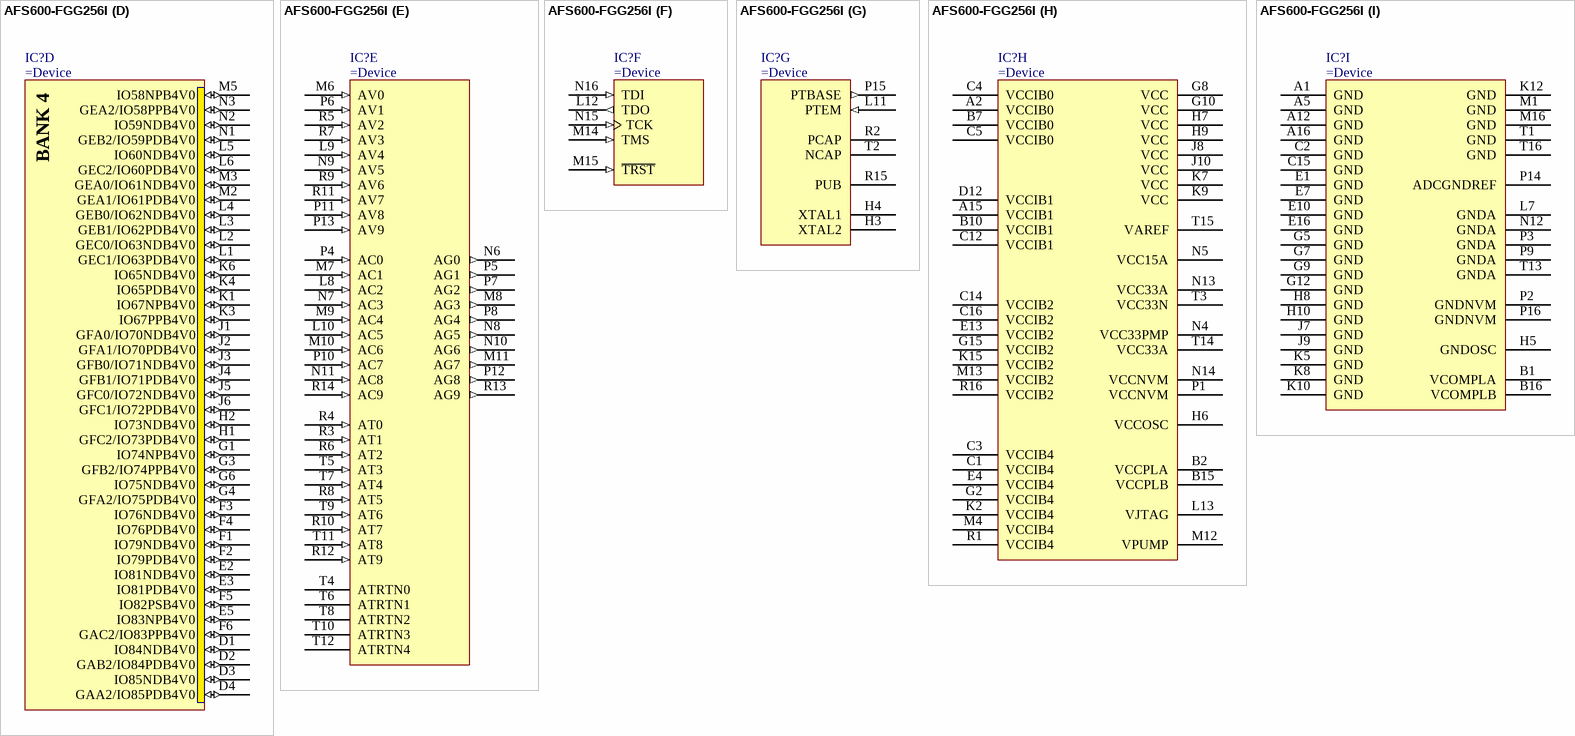
[diagram p25: symbol AFS600-FGG256I]